# Altium schematic symbol library jlcpcb_2025_04_capacitors_extended_1206.schlib: 2503 symbols (part 11 of 14) (continued)
## GRM31A7U3A330JW31D
designator C?  Capacitance: 33pF  (hidden comment: *)
Capacitor, Ceramic (MLCC), 33pF, ±5%, 1kV, U2J, ±5%, SMD 1206; Manufacturer: Murata Electronics; Manufacturer Part Number: GRM31A7U3A330JW31D; Package Size: 1206; JLCPCB Basic Part: No; JLCPCB Part Number: C162470; Supplier 1: LCSC; Category: Capacitors - MLCC; Supplier Part Number 1: C162470; Tolerance: ±5%; Voltage Rating: 1kV; Temperature Coefficient: U2J; RoHS: Yes; ComponentLink1Description: Datasheet; ComponentLink1URL: https://wmsc.lcsc.com/wmsc/upload/file/pdf/v2/lcsc/1811150411_Murata-Electronics-GRM31A7U3A330JW31D_C162470.pdf; ComponentLink2Description: JLCPCB Part URL; ComponentLink2URL: https://jlcpcb.com/partdetail/C162470; ComponentLink3Description: LCSC Part URL; ComponentLink3URL: https://lcsc.com/product-detail/Multilayer-Ceramic-Capacitors-MLCC---SMD-SMT_Murata-Electronics-Murata-Electronics-GRM31A7U3A330JW31D_C162470.html
footprint CAP-1206 (1206 (3216M) Capacitor)
pins: 1, 2

## GRM31A7U3A331JW31D
designator C?  Capacitance: 330pF  (hidden comment: *)
Capacitor, Ceramic (MLCC), 330pF, ±5%, 1kV, U2J, ±5%, SMD 1206; Manufacturer: Murata Electronics; Manufacturer Part Number: GRM31A7U3A331JW31D; Package Size: 1206; JLCPCB Basic Part: No; JLCPCB Part Number: C162471; Supplier 1: LCSC; Category: Capacitors - MLCC; Supplier Part Number 1: C162471; Tolerance: ±5%; Voltage Rating: 1kV; Temperature Coefficient: U2J; RoHS: Yes; ComponentLink1Description: Datasheet; ComponentLink1URL: https://wmsc.lcsc.com/wmsc/upload/file/pdf/v2/lcsc/2304140030_Murata-Electronics-GRM31A7U3A331JW31D_C162471.pdf; ComponentLink2Description: JLCPCB Part URL; ComponentLink2URL: https://jlcpcb.com/partdetail/C162471; ComponentLink3Description: LCSC Part URL; ComponentLink3URL: https://lcsc.com/product-detail/Multilayer-Ceramic-Capacitors-MLCC---SMD-SMT_Murata-Electronics-Murata-Electronics-GRM31A7U3A331JW31D_C162471.html
footprint CAP-1206 (1206 (3216M) Capacitor)
pins: 1, 2

## GRM31A7U3A470JW31D
designator C?  Capacitance: 47pF  (hidden comment: *)
Capacitor, Ceramic (MLCC), 47pF, ±5%, 1kV, U2J, ±5%, SMD 1206; Manufacturer: Murata Electronics; Manufacturer Part Number: GRM31A7U3A470JW31D; Package Size: 1206; JLCPCB Basic Part: No; JLCPCB Part Number: C668365; Supplier 1: LCSC; Category: Capacitors - MLCC; Supplier Part Number 1: C668365; Tolerance: ±5%; Voltage Rating: 1kV; Temperature Coefficient: U2J; RoHS: Yes; ComponentLink1Description: Datasheet; ComponentLink1URL: https://wmsc.lcsc.com/wmsc/upload/file/pdf/v2/lcsc/2202161830_Murata-Electronics-GRM31A7U3A470JW31D_C668365.pdf; ComponentLink2Description: JLCPCB Part URL; ComponentLink2URL: https://jlcpcb.com/partdetail/C668365; ComponentLink3Description: LCSC Part URL; ComponentLink3URL: https://lcsc.com/product-detail/Multilayer-Ceramic-Capacitors-MLCC---SMD-SMT_Murata-Electronics-Murata-Electronics-GRM31A7U3A470JW31D_C668365.html
footprint CAP-1206 (1206 (3216M) Capacitor)
pins: 1, 2

## GRM31A7U3A680JW31D
designator C?  Capacitance: 68pF  (hidden comment: *)
Capacitor, Ceramic (MLCC), 68pF, ±5%, 1kV, U2J, ±5%, SMD 1206; Manufacturer: Murata Electronics; Manufacturer Part Number: GRM31A7U3A680JW31D; Package Size: 1206; JLCPCB Basic Part: No; JLCPCB Part Number: C703096; Supplier 1: LCSC; Category: Capacitors - MLCC; Supplier Part Number 1: C703096; Tolerance: ±5%; Voltage Rating: 1kV; Temperature Coefficient: U2J; RoHS: Yes; ComponentLink1Description: Datasheet; ComponentLink1URL: https://wmsc.lcsc.com/wmsc/upload/file/pdf/v2/lcsc/2304140030_Murata-Electronics-GRM31A7U3A680JW31D_C703096.pdf; ComponentLink2Description: JLCPCB Part URL; ComponentLink2URL: https://jlcpcb.com/partdetail/C703096; ComponentLink3Description: LCSC Part URL; ComponentLink3URL: https://lcsc.com/product-detail/Multilayer-Ceramic-Capacitors-MLCC---SMD-SMT_Murata-Electronics-Murata-Electronics-GRM31A7U3A680JW31D_C703096.html
footprint CAP-1206 (1206 (3216M) Capacitor)
pins: 1, 2

## GRM31A7U3A820JW31D
designator C?  Capacitance: 82pF  (hidden comment: *)
Capacitor, Ceramic (MLCC), 82pF, ±5%, 1kV, U2J, ±5%, SMD 1206; Manufacturer: Murata Electronics; Manufacturer Part Number: GRM31A7U3A820JW31D; Package Size: 1206; JLCPCB Basic Part: No; JLCPCB Part Number: C711031; Supplier 1: LCSC; Category: Capacitors - MLCC; Supplier Part Number 1: C711031; Tolerance: ±5%; Voltage Rating: 1kV; Temperature Coefficient: U2J; RoHS: Yes; ComponentLink1Description: Datasheet; ComponentLink1URL: https://wmsc.lcsc.com/wmsc/upload/file/pdf/v2/lcsc/2104151942_Murata-Electronics-GRM31A7U3A820JW31D_C711031.pdf; ComponentLink2Description: JLCPCB Part URL; ComponentLink2URL: https://jlcpcb.com/partdetail/C711031; ComponentLink3Description: LCSC Part URL; ComponentLink3URL: https://lcsc.com/product-detail/Multilayer-Ceramic-Capacitors-MLCC---SMD-SMT_Murata-Electronics-Murata-Electronics-GRM31A7U3A820JW31D_C711031.html
footprint CAP-1206 (1206 (3216M) Capacitor)
pins: 1, 2

## GRM31AR72H152KW01D
designator C?  Capacitance: 1.5nF  (hidden comment: *)
Capacitor, Ceramic (MLCC), 1.5nF, ±10%, 500V, X7R, ±10%, SMD 1206; Manufacturer: Murata Electronics; Manufacturer Part Number: GRM31AR72H152KW01D; Package Size: 1206; JLCPCB Basic Part: No; JLCPCB Part Number: C469547; Supplier 1: LCSC; Category: Capacitors - MLCC; Supplier Part Number 1: C469547; Tolerance: ±10%; Voltage Rating: 500V; Temperature Coefficient: X7R; RoHS: Yes; ComponentLink1Description: Datasheet; ComponentLink1URL: https://wmsc.lcsc.com/wmsc/upload/file/pdf/v2/lcsc/2304140030_Murata-Electronics-GRM31AR72H152KW01D_C469547.pdf; ComponentLink2Description: JLCPCB Part URL; ComponentLink2URL: https://jlcpcb.com/partdetail/C469547; ComponentLink3Description: LCSC Part URL; ComponentLink3URL: https://lcsc.com/product-detail/Multilayer-Ceramic-Capacitors-MLCC---SMD-SMT_Murata-Electronics-Murata-Electronics-GRM31AR72H152KW01D_C469547.html
footprint CAP-1206 (1206 (3216M) Capacitor)
pins: 1, 2

## GRM31AR72J103KW01D
designator C?  Capacitance: 10nF  (hidden comment: *)
Capacitor, Ceramic (MLCC), 10nF, ±10%, 630V, X7R, ±10%, SMD 1206; Manufacturer: Murata Electronics; Manufacturer Part Number: GRM31AR72J103KW01D; Package Size: 1206; JLCPCB Basic Part: No; JLCPCB Part Number: C437561; Supplier 1: LCSC; Category: Capacitors - MLCC; Supplier Part Number 1: C437561; Tolerance: ±10%; Voltage Rating: 630V; Temperature Coefficient: X7R; RoHS: Yes; ComponentLink1Description: Datasheet; ComponentLink1URL: https://wmsc.lcsc.com/wmsc/upload/file/pdf/v2/lcsc/2304140030_Murata-Electronics-GRM31AR72J103KW01D_C437561.pdf; ComponentLink2Description: JLCPCB Part URL; ComponentLink2URL: https://jlcpcb.com/partdetail/C437561; ComponentLink3Description: LCSC Part URL; ComponentLink3URL: https://lcsc.com/product-detail/Multilayer-Ceramic-Capacitors-MLCC---SMD-SMT_Murata-Electronics-Murata-Electronics-GRM31AR72J103KW01D_C437561.html
footprint CAP-1206 (1206 (3216M) Capacitor)
pins: 1, 2

## GRM31AR72J222KW01D
designator C?  Capacitance: 2.2nF  (hidden comment: *)
Capacitor, Ceramic (MLCC), 2.2nF, ±10%, 630V, X7R, ±10%, SMD 1206; Manufacturer: Murata Electronics; Manufacturer Part Number: GRM31AR72J222KW01D; Package Size: 1206; JLCPCB Basic Part: No; JLCPCB Part Number: C162473; Supplier 1: LCSC; Category: Capacitors - MLCC; Supplier Part Number 1: C162473; Tolerance: ±10%; Voltage Rating: 630V; Temperature Coefficient: X7R; RoHS: Yes; ComponentLink1Description: Datasheet; ComponentLink1URL: https://wmsc.lcsc.com/wmsc/upload/file/pdf/v2/lcsc/2308111643_Murata-Electronics-GRM31AR72J222KW01D_C162473.pdf; ComponentLink2Description: JLCPCB Part URL; ComponentLink2URL: https://jlcpcb.com/partdetail/C162473; ComponentLink3Description: LCSC Part URL; ComponentLink3URL: https://lcsc.com/product-detail/Multilayer-Ceramic-Capacitors-MLCC---SMD-SMT_Murata-Electronics-Murata-Electronics-GRM31AR72J222KW01D_C162473.html
footprint CAP-1206 (1206 (3216M) Capacitor)
pins: 1, 2

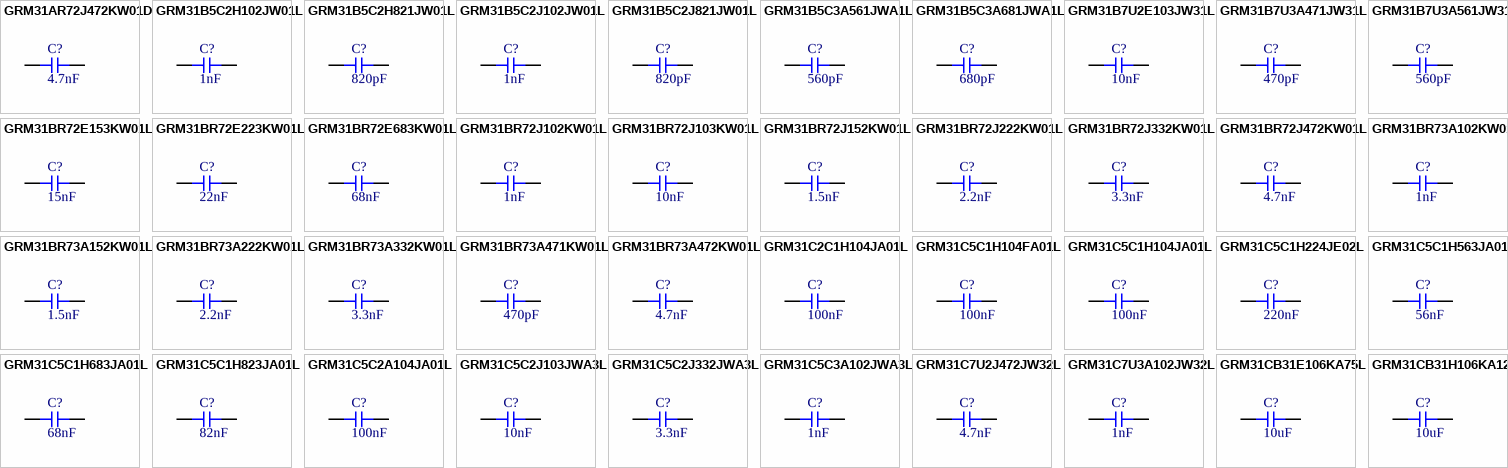
[diagram p47: symbols GRM31AR72J472KW01D to GRM31CB31H106KA12L]

## GRM31AR72J472KW01D
designator C?  Capacitance: 4.7nF  (hidden comment: *)
Capacitor, Ceramic (MLCC), 4.7nF, ±10%, 630V, X7R, ±10%, SMD 1206; Manufacturer: Murata Electronics; Manufacturer Part Number: GRM31AR72J472KW01D; Package Size: 1206; JLCPCB Basic Part: No; JLCPCB Part Number: C162474; Supplier 1: LCSC; Category: Capacitors - MLCC; Supplier Part Number 1: C162474; Tolerance: ±10%; Voltage Rating: 630V; Temperature Coefficient: X7R; RoHS: Yes; ComponentLink1Description: Datasheet; ComponentLink1URL: https://wmsc.lcsc.com/wmsc/upload/file/pdf/v2/lcsc/1912111437_Murata-Electronics-GRM31AR72J472KW01D_C162474.pdf; ComponentLink2Description: JLCPCB Part URL; ComponentLink2URL: https://jlcpcb.com/partdetail/C162474; ComponentLink3Description: LCSC Part URL; ComponentLink3URL: https://lcsc.com/product-detail/Multilayer-Ceramic-Capacitors-MLCC---SMD-SMT_Murata-Electronics-Murata-Electronics-GRM31AR72J472KW01D_C162474.html
footprint CAP-1206 (1206 (3216M) Capacitor)
pins: 1, 2

## GRM31B5C2H102JW01L
designator C?  Capacitance: 1nF  (hidden comment: *)
Capacitor, Ceramic (MLCC), 1nF, ±5%, 500V, C0G, ±5%, SMD 1206; Manufacturer: Murata Electronics; Manufacturer Part Number: GRM31B5C2H102JW01L; Package Size: 1206; JLCPCB Basic Part: No; JLCPCB Part Number: C162475; Supplier 1: LCSC; Category: Capacitors - MLCC; Supplier Part Number 1: C162475; Tolerance: ±5%; Voltage Rating: 500V; Temperature Coefficient: C0G; RoHS: Yes; ComponentLink1Description: Datasheet; ComponentLink1URL: https://wmsc.lcsc.com/wmsc/upload/file/pdf/v2/lcsc/2304140030_Murata-Electronics-GRM31B5C2H102JW01L_C162475.pdf; ComponentLink2Description: JLCPCB Part URL; ComponentLink2URL: https://jlcpcb.com/partdetail/C162475; ComponentLink3Description: LCSC Part URL; ComponentLink3URL: https://lcsc.com/product-detail/Multilayer-Ceramic-Capacitors-MLCC---SMD-SMT_Murata-Electronics-Murata-Electronics-GRM31B5C2H102JW01L_C162475.html
footprint CAP-1206 (1206 (3216M) Capacitor)
pins: 1, 2

## GRM31B5C2H821JW01L
designator C?  Capacitance: 820pF  (hidden comment: *)
Capacitor, Ceramic (MLCC), 820pF, ±5%, 500V, null, ±5%, SMD 1206; Manufacturer: Murata Electronics; Manufacturer Part Number: GRM31B5C2H821JW01L; Package Size: 1206; JLCPCB Basic Part: No; JLCPCB Part Number: C883560; Supplier 1: LCSC; Category: Capacitors - MLCC; Supplier Part Number 1: C883560; Tolerance: ±5%; Voltage Rating: 500V; Temperature Coefficient: null; RoHS: Yes; ComponentLink1Description: Datasheet; ComponentLink1URL: https://wmsc.lcsc.com/wmsc/upload/file/pdf/v2/lcsc/2304140030_Murata-Electronics-GRM31B5C2H821JW01L_C883560.pdf; ComponentLink2Description: JLCPCB Part URL; ComponentLink2URL: https://jlcpcb.com/partdetail/C883560; ComponentLink3Description: LCSC Part URL; ComponentLink3URL: https://lcsc.com/product-detail/Multilayer-Ceramic-Capacitors-MLCC---SMD-SMT_Murata-Electronics-Murata-Electronics-GRM31B5C2H821JW01L_C883560.html
footprint CAP-1206 (1206 (3216M) Capacitor)
pins: 1, 2

## GRM31B5C2J102JW01L
designator C?  Capacitance: 1nF  (hidden comment: *)
Capacitor, Ceramic (MLCC), 1nF, ±5%, 630V, C0G, ±5%, SMD 1206; Manufacturer: Murata Electronics; Manufacturer Part Number: GRM31B5C2J102JW01L; Package Size: 1206; JLCPCB Basic Part: No; JLCPCB Part Number: C162476; Supplier 1: LCSC; Category: Capacitors - MLCC; Supplier Part Number 1: C162476; Tolerance: ±5%; Voltage Rating: 630V; Temperature Coefficient: C0G; RoHS: Yes; ComponentLink1Description: Datasheet; ComponentLink1URL: https://wmsc.lcsc.com/wmsc/upload/file/pdf/v2/lcsc/1810201234_Murata-Electronics-GRM31B5C2J102JW01L_C162476.pdf; ComponentLink2Description: JLCPCB Part URL; ComponentLink2URL: https://jlcpcb.com/partdetail/C162476; ComponentLink3Description: LCSC Part URL; ComponentLink3URL: https://lcsc.com/product-detail/Multilayer-Ceramic-Capacitors-MLCC---SMD-SMT_Murata-Electronics-Murata-Electronics-GRM31B5C2J102JW01L_C162476.html
footprint CAP-1206 (1206 (3216M) Capacitor)
pins: 1, 2

## GRM31B5C2J821JW01L
designator C?  Capacitance: 820pF  (hidden comment: *)
Capacitor, Ceramic (MLCC), 820pF, ±5%, 630V, null, ±5%, SMD 1206; Manufacturer: Murata Electronics; Manufacturer Part Number: GRM31B5C2J821JW01L; Package Size: 1206; JLCPCB Basic Part: No; JLCPCB Part Number: C701157; Supplier 1: LCSC; Category: Capacitors - MLCC; Supplier Part Number 1: C701157; Tolerance: ±5%; Voltage Rating: 630V; Temperature Coefficient: null; RoHS: Yes; ComponentLink1Description: Datasheet; ComponentLink1URL: https://wmsc.lcsc.com/wmsc/upload/file/pdf/v2/lcsc/2011072005_Murata-Electronics-GRM31B5C2J821JW01L_C701157.pdf; ComponentLink2Description: JLCPCB Part URL; ComponentLink2URL: https://jlcpcb.com/partdetail/C701157; ComponentLink3Description: LCSC Part URL; ComponentLink3URL: https://lcsc.com/product-detail/Multilayer-Ceramic-Capacitors-MLCC---SMD-SMT_Murata-Electronics-Murata-Electronics-GRM31B5C2J821JW01L_C701157.html
footprint CAP-1206 (1206 (3216M) Capacitor)
pins: 1, 2

## GRM31B5C3A561JWA1L
designator C?  Capacitance: 560pF  (hidden comment: *)
Capacitor, Ceramic (MLCC), 560pF, ±5%, 1kV, C0G, ±5%, SMD 1206; Manufacturer: Murata Electronics; Manufacturer Part Number: GRM31B5C3A561JWA1L; Package Size: 1206; JLCPCB Basic Part: No; JLCPCB Part Number: C415410; Supplier 1: LCSC; Category: Capacitors - MLCC; Supplier Part Number 1: C415410; Tolerance: ±5%; Voltage Rating: 1kV; Temperature Coefficient: C0G; RoHS: Yes; ComponentLink1Description: Datasheet; ComponentLink1URL: https://wmsc.lcsc.com/wmsc/upload/file/pdf/v2/lcsc/2304140030_Murata-Electronics-GRM31B5C3A561JWA1L_C415410.pdf; ComponentLink2Description: JLCPCB Part URL; ComponentLink2URL: https://jlcpcb.com/partdetail/C415410; ComponentLink3Description: LCSC Part URL; ComponentLink3URL: https://lcsc.com/product-detail/Multilayer-Ceramic-Capacitors-MLCC---SMD-SMT_Murata-Electronics-Murata-Electronics-GRM31B5C3A561JWA1L_C415410.html
footprint CAP-1206 (1206 (3216M) Capacitor)
pins: 1, 2

## GRM31B5C3A681JWA1L
designator C?  Capacitance: 680pF  (hidden comment: *)
Capacitor, Ceramic (MLCC), 680pF, ±5%, ±5%, SMD 1206; Manufacturer: Murata Electronics; Manufacturer Part Number: GRM31B5C3A681JWA1L; Package Size: 1206; JLCPCB Basic Part: No; JLCPCB Part Number: C913483; Supplier 1: LCSC; Category: Capacitors - MLCC; Supplier Part Number 1: C913483; Tolerance: ±5%; RoHS: Yes; ComponentLink1Description: Datasheet; ComponentLink1URL: https://wmsc.lcsc.com/wmsc/upload/file/pdf/v2/lcsc/2201131300_Murata-Electronics-GRM31B5C3A681JWA1L_C913483.pdf; ComponentLink2Description: JLCPCB Part URL; ComponentLink2URL: https://jlcpcb.com/partdetail/C913483; ComponentLink3Description: LCSC Part URL; ComponentLink3URL: https://lcsc.com/product-detail/Multilayer-Ceramic-Capacitors-MLCC---SMD-SMT_Murata-Electronics-Murata-Electronics-GRM31B5C3A681JWA1L_C913483.html
footprint CAP-1206 (1206 (3216M) Capacitor)
pins: 1, 2

## GRM31B7U2E103JW31L
designator C?  Capacitance: 10nF  (hidden comment: *)
Capacitor, Ceramic (MLCC), 10nF, ±5%, 250V, U2J, ±5%, SMD 1206; Manufacturer: Murata Electronics; Manufacturer Part Number: GRM31B7U2E103JW31L; Package Size: 1206; JLCPCB Basic Part: No; JLCPCB Part Number: C426091; Supplier 1: LCSC; Category: Capacitors - MLCC; Supplier Part Number 1: C426091; Tolerance: ±5%; Voltage Rating: 250V; Temperature Coefficient: U2J; RoHS: Yes; ComponentLink1Description: Datasheet; ComponentLink1URL: https://wmsc.lcsc.com/wmsc/upload/file/pdf/v2/lcsc/2304140030_Murata-Electronics-GRM31B7U2E103JW31L_C426091.pdf; ComponentLink2Description: JLCPCB Part URL; ComponentLink2URL: https://jlcpcb.com/partdetail/C426091; ComponentLink3Description: LCSC Part URL; ComponentLink3URL: https://lcsc.com/product-detail/Multilayer-Ceramic-Capacitors-MLCC---SMD-SMT_Murata-Electronics-Murata-Electronics-GRM31B7U2E103JW31L_C426091.html
footprint CAP-1206 (1206 (3216M) Capacitor)
pins: 1, 2

## GRM31B7U3A471JW31L
designator C?  Capacitance: 470pF  (hidden comment: *)
Capacitor, Ceramic (MLCC), 470pF, ±5%, 1kV, U2J, ±5%, SMD 1206; Manufacturer: Murata Electronics; Manufacturer Part Number: GRM31B7U3A471JW31L; Package Size: 1206; JLCPCB Basic Part: No; JLCPCB Part Number: C97936; Supplier 1: LCSC; Category: Capacitors - MLCC; Supplier Part Number 1: C97936; Tolerance: ±5%; Voltage Rating: 1kV; Temperature Coefficient: U2J; RoHS: Yes; ComponentLink1Description: Datasheet; ComponentLink1URL: https://wmsc.lcsc.com/wmsc/upload/file/pdf/v2/lcsc/1810201308_Murata-Electronics-GRM31B7U3A471JW31L_C97936.pdf; ComponentLink2Description: JLCPCB Part URL; ComponentLink2URL: https://jlcpcb.com/partdetail/C97936; ComponentLink3Description: LCSC Part URL; ComponentLink3URL: https://lcsc.com/product-detail/Multilayer-Ceramic-Capacitors-MLCC---SMD-SMT_Murata-Electronics-Murata-Electronics-GRM31B7U3A471JW31L_C97936.html
footprint CAP-1206 (1206 (3216M) Capacitor)
pins: 1, 2

## GRM31B7U3A561JW31L
designator C?  Capacitance: 560pF  (hidden comment: *)
Capacitor, Ceramic (MLCC), 560pF, ±5%, 1kV, U2J, ±5%, SMD 1206; Manufacturer: Murata Electronics; Manufacturer Part Number: GRM31B7U3A561JW31L; Package Size: 1206; JLCPCB Basic Part: No; JLCPCB Part Number: C711035; Supplier 1: LCSC; Category: Capacitors - MLCC; Supplier Part Number 1: C711035; Tolerance: ±5%; Voltage Rating: 1kV; Temperature Coefficient: U2J; RoHS: Yes; ComponentLink1Description: Datasheet; ComponentLink1URL: https://wmsc.lcsc.com/wmsc/upload/file/pdf/v2/lcsc/2012231244_Murata-Electronics-GRM31B7U3A561JW31L_C711035.pdf; ComponentLink2Description: JLCPCB Part URL; ComponentLink2URL: https://jlcpcb.com/partdetail/C711035; ComponentLink3Description: LCSC Part URL; ComponentLink3URL: https://lcsc.com/product-detail/Multilayer-Ceramic-Capacitors-MLCC---SMD-SMT_Murata-Electronics-Murata-Electronics-GRM31B7U3A561JW31L_C711035.html
footprint CAP-1206 (1206 (3216M) Capacitor)
pins: 1, 2

## GRM31BR72E153KW01L
designator C?  Capacitance: 15nF  (hidden comment: *)
Capacitor, Ceramic (MLCC), 15nF, ±10%, 250V, X7R, ±10%, SMD 1206; Manufacturer: Murata Electronics; Manufacturer Part Number: GRM31BR72E153KW01L; Package Size: 1206; JLCPCB Basic Part: No; JLCPCB Part Number: C162477; Supplier 1: LCSC; Category: Capacitors - MLCC; Supplier Part Number 1: C162477; Tolerance: ±10%; Voltage Rating: 250V; Temperature Coefficient: X7R; RoHS: Yes; ComponentLink1Description: Datasheet; ComponentLink1URL: https://wmsc.lcsc.com/wmsc/upload/file/pdf/v2/lcsc/1810201234_Murata-Electronics-GRM31BR72E153KW01L_C162477.pdf; ComponentLink2Description: JLCPCB Part URL; ComponentLink2URL: https://jlcpcb.com/partdetail/C162477; ComponentLink3Description: LCSC Part URL; ComponentLink3URL: https://lcsc.com/product-detail/Multilayer-Ceramic-Capacitors-MLCC---SMD-SMT_Murata-Electronics-Murata-Electronics-GRM31BR72E153KW01L_C162477.html
footprint CAP-1206 (1206 (3216M) Capacitor)
pins: 1, 2

## GRM31BR72E223KW01L
designator C?  Capacitance: 22nF  (hidden comment: *)
Capacitor, Ceramic (MLCC), 22nF, ±10%, 250V, X7R, ±10%, SMD 1206; Manufacturer: Murata Electronics; Manufacturer Part Number: GRM31BR72E223KW01L; Package Size: 1206; JLCPCB Basic Part: No; JLCPCB Part Number: C86048; Supplier 1: LCSC; Category: Capacitors - MLCC; Supplier Part Number 1: C86048; Tolerance: ±10%; Voltage Rating: 250V; Temperature Coefficient: X7R; RoHS: Yes; ComponentLink1Description: Datasheet; ComponentLink1URL: https://wmsc.lcsc.com/wmsc/upload/file/pdf/v2/lcsc/2304140030_Murata-Electronics-GRM31BR72E223KW01L_C86048.pdf; ComponentLink2Description: JLCPCB Part URL; ComponentLink2URL: https://jlcpcb.com/partdetail/C86048; ComponentLink3Description: LCSC Part URL; ComponentLink3URL: https://lcsc.com/product-detail/Multilayer-Ceramic-Capacitors-MLCC---SMD-SMT_Murata-Electronics-Murata-Electronics-GRM31BR72E223KW01L_C86048.html
footprint CAP-1206 (1206 (3216M) Capacitor)
pins: 1, 2

## GRM31BR72E683KW01L
designator C?  Capacitance: 68nF  (hidden comment: *)
Capacitor, Ceramic (MLCC), 68nF, ±10%, 250V, X7R, ±10%, SMD 1206; Manufacturer: Murata Electronics; Manufacturer Part Number: GRM31BR72E683KW01L; Package Size: 1206; JLCPCB Basic Part: No; JLCPCB Part Number: C162478; Supplier 1: LCSC; Category: Capacitors - MLCC; Supplier Part Number 1: C162478; Tolerance: ±10%; Voltage Rating: 250V; Temperature Coefficient: X7R; RoHS: Yes; ComponentLink1Description: Datasheet; ComponentLink1URL: https://wmsc.lcsc.com/wmsc/upload/file/pdf/v2/lcsc/1810201241_Murata-Electronics-GRM31BR72E683KW01L_C162478.pdf; ComponentLink2Description: JLCPCB Part URL; ComponentLink2URL: https://jlcpcb.com/partdetail/C162478; ComponentLink3Description: LCSC Part URL; ComponentLink3URL: https://lcsc.com/product-detail/Multilayer-Ceramic-Capacitors-MLCC---SMD-SMT_Murata-Electronics-Murata-Electronics-GRM31BR72E683KW01L_C162478.html
footprint CAP-1206 (1206 (3216M) Capacitor)
pins: 1, 2

## GRM31BR72J102KW01L
designator C?  Capacitance: 1nF  (hidden comment: *)
Capacitor, Ceramic (MLCC), 1nF, ±10%, 630V, X7R, ±10%, SMD 1206; Manufacturer: Murata Electronics; Manufacturer Part Number: GRM31BR72J102KW01L; Package Size: 1206; JLCPCB Basic Part: No; JLCPCB Part Number: C97937; Supplier 1: LCSC; Category: Capacitors - MLCC; Supplier Part Number 1: C97937; Tolerance: ±10%; Voltage Rating: 630V; Temperature Coefficient: X7R; RoHS: Yes; ComponentLink1Description: Datasheet; ComponentLink1URL: https://wmsc.lcsc.com/wmsc/upload/file/pdf/v2/lcsc/1811122014_Murata-Electronics-GRM31BR72J102KW01L_C97937.pdf; ComponentLink2Description: JLCPCB Part URL; ComponentLink2URL: https://jlcpcb.com/partdetail/C97937; ComponentLink3Description: LCSC Part URL; ComponentLink3URL: https://lcsc.com/product-detail/Multilayer-Ceramic-Capacitors-MLCC---SMD-SMT_Murata-Electronics-Murata-Electronics-GRM31BR72J102KW01L_C97937.html
footprint CAP-1206 (1206 (3216M) Capacitor)
pins: 1, 2

## GRM31BR72J103KW01L
designator C?  Capacitance: 10nF  (hidden comment: *)
Capacitor, Ceramic (MLCC), 10nF, ±10%, 630V, X7R, ±10%, SMD 1206; Manufacturer: Murata Electronics; Manufacturer Part Number: GRM31BR72J103KW01L; Package Size: 1206; JLCPCB Basic Part: No; JLCPCB Part Number: C76989; Supplier 1: LCSC; Category: Capacitors - MLCC; Supplier Part Number 1: C76989; Tolerance: ±10%; Voltage Rating: 630V; Temperature Coefficient: X7R; RoHS: Yes; ComponentLink1Description: Datasheet; ComponentLink1URL: https://wmsc.lcsc.com/wmsc/upload/file/pdf/v2/lcsc/1810201310_Murata-Electronics-GRM31BR72J103KW01L_C76989.pdf; ComponentLink2Description: JLCPCB Part URL; ComponentLink2URL: https://jlcpcb.com/partdetail/C76989; ComponentLink3Description: LCSC Part URL; ComponentLink3URL: https://lcsc.com/product-detail/Multilayer-Ceramic-Capacitors-MLCC---SMD-SMT_Murata-Electronics-Murata-Electronics-GRM31BR72J103KW01L_C76989.html
footprint CAP-1206 (1206 (3216M) Capacitor)
pins: 1, 2

## GRM31BR72J152KW01L
designator C?  Capacitance: 1.5nF  (hidden comment: *)
Capacitor, Ceramic (MLCC), 1.5nF, ±10%, 630V, X7R, ±10%, SMD 1206; Manufacturer: Murata Electronics; Manufacturer Part Number: GRM31BR72J152KW01L; Package Size: 1206; JLCPCB Basic Part: No; JLCPCB Part Number: C162479; Supplier 1: LCSC; Category: Capacitors - MLCC; Supplier Part Number 1: C162479; Tolerance: ±10%; Voltage Rating: 630V; Temperature Coefficient: X7R; RoHS: Yes; ComponentLink1Description: Datasheet; ComponentLink1URL: https://wmsc.lcsc.com/wmsc/upload/file/pdf/v2/lcsc/1810201241_Murata-Electronics-GRM31BR72J152KW01L_C162479.pdf; ComponentLink2Description: JLCPCB Part URL; ComponentLink2URL: https://jlcpcb.com/partdetail/C162479; ComponentLink3Description: LCSC Part URL; ComponentLink3URL: https://lcsc.com/product-detail/Multilayer-Ceramic-Capacitors-MLCC---SMD-SMT_Murata-Electronics-Murata-Electronics-GRM31BR72J152KW01L_C162479.html
footprint CAP-1206 (1206 (3216M) Capacitor)
pins: 1, 2

## GRM31BR72J222KW01L
designator C?  Capacitance: 2.2nF  (hidden comment: *)
Capacitor, Ceramic (MLCC), 2.2nF, ±10%, 630V, X7R, ±10%, SMD 1206; Manufacturer: Murata Electronics; Manufacturer Part Number: GRM31BR72J222KW01L; Package Size: 1206; JLCPCB Basic Part: No; JLCPCB Part Number: C97938; Supplier 1: LCSC; Category: Capacitors - MLCC; Supplier Part Number 1: C97938; Tolerance: ±10%; Voltage Rating: 630V; Temperature Coefficient: X7R; RoHS: Yes; ComponentLink1Description: Datasheet; ComponentLink1URL: https://wmsc.lcsc.com/wmsc/upload/file/pdf/v2/lcsc/1810201314_Murata-Electronics-GRM31BR72J222KW01L_C97938.pdf; ComponentLink2Description: JLCPCB Part URL; ComponentLink2URL: https://jlcpcb.com/partdetail/C97938; ComponentLink3Description: LCSC Part URL; ComponentLink3URL: https://lcsc.com/product-detail/Multilayer-Ceramic-Capacitors-MLCC---SMD-SMT_Murata-Electronics-Murata-Electronics-GRM31BR72J222KW01L_C97938.html
footprint CAP-1206 (1206 (3216M) Capacitor)
pins: 1, 2

## GRM31BR72J332KW01L
designator C?  Capacitance: 3.3nF  (hidden comment: *)
Capacitor, Ceramic (MLCC), 3.3nF, ±10%, 630V, X7R, ±10%, SMD 1206; Manufacturer: Murata Electronics; Manufacturer Part Number: GRM31BR72J332KW01L; Package Size: 1206; JLCPCB Basic Part: No; JLCPCB Part Number: C97939; Supplier 1: LCSC; Category: Capacitors - MLCC; Supplier Part Number 1: C97939; Tolerance: ±10%; Voltage Rating: 630V; Temperature Coefficient: X7R; RoHS: Yes; ComponentLink1Description: Datasheet; ComponentLink1URL: https://wmsc.lcsc.com/wmsc/upload/file/pdf/v2/lcsc/1810201314_Murata-Electronics-GRM31BR72J332KW01L_C97939.pdf; ComponentLink2Description: JLCPCB Part URL; ComponentLink2URL: https://jlcpcb.com/partdetail/C97939; ComponentLink3Description: LCSC Part URL; ComponentLink3URL: https://lcsc.com/product-detail/Multilayer-Ceramic-Capacitors-MLCC---SMD-SMT_Murata-Electronics-Murata-Electronics-GRM31BR72J332KW01L_C97939.html
footprint CAP-1206 (1206 (3216M) Capacitor)
pins: 1, 2

## GRM31BR72J472KW01L
designator C?  Capacitance: 4.7nF  (hidden comment: *)
Capacitor, Ceramic (MLCC), 4.7nF, ±10%, 630V, X7R, ±10%, SMD 1206; Manufacturer: Murata Electronics; Manufacturer Part Number: GRM31BR72J472KW01L; Package Size: 1206; JLCPCB Basic Part: No; JLCPCB Part Number: C97940; Supplier 1: LCSC; Category: Capacitors - MLCC; Supplier Part Number 1: C97940; Tolerance: ±10%; Voltage Rating: 630V; Temperature Coefficient: X7R; RoHS: Yes; ComponentLink1Description: Datasheet; ComponentLink1URL: https://wmsc.lcsc.com/wmsc/upload/file/pdf/v2/lcsc/1811142010_Murata-Electronics-GRM31BR72J472KW01L_C97940.pdf; ComponentLink2Description: JLCPCB Part URL; ComponentLink2URL: https://jlcpcb.com/partdetail/C97940; ComponentLink3Description: LCSC Part URL; ComponentLink3URL: https://lcsc.com/product-detail/Multilayer-Ceramic-Capacitors-MLCC---SMD-SMT_Murata-Electronics-Murata-Electronics-GRM31BR72J472KW01L_C97940.html
footprint CAP-1206 (1206 (3216M) Capacitor)
pins: 1, 2

## GRM31BR73A102KW01L
designator C?  Capacitance: 1nF  (hidden comment: *)
Capacitor, Ceramic (MLCC), 1nF, ±10%, 1kV, X7R, ±10%, SMD 1206; Manufacturer: Murata Electronics; Manufacturer Part Number: GRM31BR73A102KW01L; Package Size: 1206; JLCPCB Basic Part: No; JLCPCB Part Number: C97941; Supplier 1: LCSC; Category: Capacitors - MLCC; Supplier Part Number 1: C97941; Tolerance: ±10%; Voltage Rating: 1kV; Temperature Coefficient: X7R; RoHS: Yes; ComponentLink1Description: Datasheet; ComponentLink1URL: https://wmsc.lcsc.com/wmsc/upload/file/pdf/v2/lcsc/1810201308_Murata-Electronics-GRM31BR73A102KW01L_C97941.pdf; ComponentLink2Description: JLCPCB Part URL; ComponentLink2URL: https://jlcpcb.com/partdetail/C97941; ComponentLink3Description: LCSC Part URL; ComponentLink3URL: https://lcsc.com/product-detail/Multilayer-Ceramic-Capacitors-MLCC---SMD-SMT_Murata-Electronics-Murata-Electronics-GRM31BR73A102KW01L_C97941.html
footprint CAP-1206 (1206 (3216M) Capacitor)
pins: 1, 2

## GRM31BR73A152KW01L
designator C?  Capacitance: 1.5nF  (hidden comment: *)
Capacitor, Ceramic (MLCC), 1.5nF, ±10%, 1kV, X7R, ±10%, SMD 1206; Manufacturer: Murata Electronics; Manufacturer Part Number: GRM31BR73A152KW01L; Package Size: 1206; JLCPCB Basic Part: No; JLCPCB Part Number: C237590; Supplier 1: LCSC; Category: Capacitors - MLCC; Supplier Part Number 1: C237590; Tolerance: ±10%; Voltage Rating: 1kV; Temperature Coefficient: X7R; RoHS: Yes; ComponentLink1Description: Datasheet; ComponentLink1URL: https://wmsc.lcsc.com/wmsc/upload/file/pdf/v2/lcsc/1912111437_Murata-Electronics-GRM31BR73A152KW01L_C237590.pdf; ComponentLink2Description: JLCPCB Part URL; ComponentLink2URL: https://jlcpcb.com/partdetail/C237590; ComponentLink3Description: LCSC Part URL; ComponentLink3URL: https://lcsc.com/product-detail/Multilayer-Ceramic-Capacitors-MLCC---SMD-SMT_Murata-Electronics-Murata-Electronics-GRM31BR73A152KW01L_C237590.html
footprint CAP-1206 (1206 (3216M) Capacitor)
pins: 1, 2

## GRM31BR73A222KW01L
designator C?  Capacitance: 2.2nF  (hidden comment: *)
Capacitor, Ceramic (MLCC), 2.2nF, ±10%, 1kV, X7R, ±10%, SMD 1206; Manufacturer: Murata Electronics; Manufacturer Part Number: GRM31BR73A222KW01L; Package Size: 1206; JLCPCB Basic Part: No; JLCPCB Part Number: C97942; Supplier 1: LCSC; Category: Capacitors - MLCC; Supplier Part Number 1: C97942; Tolerance: ±10%; Voltage Rating: 1kV; Temperature Coefficient: X7R; RoHS: Yes; ComponentLink1Description: Datasheet; ComponentLink1URL: https://wmsc.lcsc.com/wmsc/upload/file/pdf/v2/lcsc/1810201308_Murata-Electronics-GRM31BR73A222KW01L_C97942.pdf; ComponentLink2Description: JLCPCB Part URL; ComponentLink2URL: https://jlcpcb.com/partdetail/C97942; ComponentLink3Description: LCSC Part URL; ComponentLink3URL: https://lcsc.com/product-detail/Multilayer-Ceramic-Capacitors-MLCC---SMD-SMT_Murata-Electronics-Murata-Electronics-GRM31BR73A222KW01L_C97942.html
footprint CAP-1206 (1206 (3216M) Capacitor)
pins: 1, 2

## GRM31BR73A332KW01L
designator C?  Capacitance: 3.3nF  (hidden comment: *)
Capacitor, Ceramic (MLCC), 3.3nF, ±10%, 1kV, X7R, ±10%, SMD 1206; Manufacturer: Murata Electronics; Manufacturer Part Number: GRM31BR73A332KW01L; Package Size: 1206; JLCPCB Basic Part: No; JLCPCB Part Number: C162481; Supplier 1: LCSC; Category: Capacitors - MLCC; Supplier Part Number 1: C162481; Tolerance: ±10%; Voltage Rating: 1kV; Temperature Coefficient: X7R; RoHS: Yes; ComponentLink1Description: Datasheet; ComponentLink1URL: https://wmsc.lcsc.com/wmsc/upload/file/pdf/v2/lcsc/1810201249_Murata-Electronics-GRM31BR73A332KW01L_C162481.pdf; ComponentLink2Description: JLCPCB Part URL; ComponentLink2URL: https://jlcpcb.com/partdetail/C162481; ComponentLink3Description: LCSC Part URL; ComponentLink3URL: https://lcsc.com/product-detail/Multilayer-Ceramic-Capacitors-MLCC---SMD-SMT_Murata-Electronics-Murata-Electronics-GRM31BR73A332KW01L_C162481.html
footprint CAP-1206 (1206 (3216M) Capacitor)
pins: 1, 2

## GRM31BR73A471KW01L
designator C?  Capacitance: 470pF  (hidden comment: *)
Capacitor, Ceramic (MLCC), 470pF, ±10%, 1kV, X7R, ±10%, SMD 1206; Manufacturer: Murata Electronics; Manufacturer Part Number: GRM31BR73A471KW01L; Package Size: 1206; JLCPCB Basic Part: No; JLCPCB Part Number: C97943; Supplier 1: LCSC; Category: Capacitors - MLCC; Supplier Part Number 1: C97943; Tolerance: ±10%; Voltage Rating: 1kV; Temperature Coefficient: X7R; RoHS: Yes; ComponentLink1Description: Datasheet; ComponentLink1URL: https://wmsc.lcsc.com/wmsc/upload/file/pdf/v2/lcsc/1810201314_Murata-Electronics-GRM31BR73A471KW01L_C97943.pdf; ComponentLink2Description: JLCPCB Part URL; ComponentLink2URL: https://jlcpcb.com/partdetail/C97943; ComponentLink3Description: LCSC Part URL; ComponentLink3URL: https://lcsc.com/product-detail/Multilayer-Ceramic-Capacitors-MLCC---SMD-SMT_Murata-Electronics-Murata-Electronics-GRM31BR73A471KW01L_C97943.html
footprint CAP-1206 (1206 (3216M) Capacitor)
pins: 1, 2

## GRM31BR73A472KW01L
designator C?  Capacitance: 4.7nF  (hidden comment: *)
Capacitor, Ceramic (MLCC), 4.7nF, ±10%, 1kV, X7R, ±10%, SMD 1206; Manufacturer: Murata Electronics; Manufacturer Part Number: GRM31BR73A472KW01L; Package Size: 1206; JLCPCB Basic Part: No; JLCPCB Part Number: C97944; Supplier 1: LCSC; Category: Capacitors - MLCC; Supplier Part Number 1: C97944; Tolerance: ±10%; Voltage Rating: 1kV; Temperature Coefficient: X7R; RoHS: Yes; ComponentLink1Description: Datasheet; ComponentLink1URL: https://wmsc.lcsc.com/wmsc/upload/file/pdf/v2/lcsc/1810201308_Murata-Electronics-GRM31BR73A472KW01L_C97944.pdf; ComponentLink2Description: JLCPCB Part URL; ComponentLink2URL: https://jlcpcb.com/partdetail/C97944; ComponentLink3Description: LCSC Part URL; ComponentLink3URL: https://lcsc.com/product-detail/Multilayer-Ceramic-Capacitors-MLCC---SMD-SMT_Murata-Electronics-Murata-Electronics-GRM31BR73A472KW01L_C97944.html
footprint CAP-1206 (1206 (3216M) Capacitor)
pins: 1, 2

## GRM31C2C1H104JA01L
designator C?  Capacitance: 100nF  (hidden comment: *)
Capacitor, Ceramic (MLCC), 100nF, ±5%, 50V, CH, ±5%, SMD 1206; Manufacturer: Murata Electronics; Manufacturer Part Number: GRM31C2C1H104JA01L; Package Size: 1206; JLCPCB Basic Part: No; JLCPCB Part Number: C397309; Supplier 1: LCSC; Category: Capacitors - MLCC; Supplier Part Number 1: C397309; Tolerance: ±5%; Voltage Rating: 50V; Temperature Coefficient: CH; RoHS: Yes; ComponentLink1Description: Datasheet; ComponentLink1URL: https://wmsc.lcsc.com/wmsc/upload/file/pdf/v2/lcsc/1912111437_Murata-Electronics-GRM31C2C1H104JA01L_C397309.pdf; ComponentLink2Description: JLCPCB Part URL; ComponentLink2URL: https://jlcpcb.com/partdetail/C397309; ComponentLink3Description: LCSC Part URL; ComponentLink3URL: https://lcsc.com/product-detail/Multilayer-Ceramic-Capacitors-MLCC---SMD-SMT_Murata-Electronics-Murata-Electronics-GRM31C2C1H104JA01L_C397309.html
footprint CAP-1206 (1206 (3216M) Capacitor)
pins: 1, 2

## GRM31C5C1H104FA01L
designator C?  Capacitance: 100nF  (hidden comment: *)
Capacitor, Ceramic (MLCC), 100nF, ±1%, 50V, C0G, ±1%, SMD 1206; Manufacturer: Murata Electronics; Manufacturer Part Number: GRM31C5C1H104FA01L; Package Size: 1206; JLCPCB Basic Part: No; JLCPCB Part Number: C2981728; Supplier 1: LCSC; Category: Capacitors - MLCC; Supplier Part Number 1: C2981728; Tolerance: ±1%; Voltage Rating: 50V; Temperature Coefficient: C0G; RoHS: Yes; ComponentLink1Description: Datasheet; ComponentLink1URL: https://wmsc.lcsc.com/wmsc/upload/file/pdf/v2/lcsc/2203241030_Murata-Electronics-GRM31C5C1H104FA01L_C2981728.pdf; ComponentLink2Description: JLCPCB Part URL; ComponentLink2URL: https://jlcpcb.com/partdetail/C2981728; ComponentLink3Description: LCSC Part URL; ComponentLink3URL: https://lcsc.com/product-detail/Multilayer-Ceramic-Capacitors-MLCC---SMD-SMT_Murata-Electronics-Murata-Electronics-GRM31C5C1H104FA01L_C2981728.html
footprint CAP-1206 (1206 (3216M) Capacitor)
pins: 1, 2

## GRM31C5C1H104JA01L
designator C?  Capacitance: 100nF  (hidden comment: *)
Capacitor, Ceramic (MLCC), 100nF, ±5%, 50V, C0G, ±5%, SMD 1206; Manufacturer: Murata Electronics; Manufacturer Part Number: GRM31C5C1H104JA01L; Package Size: 1206; JLCPCB Basic Part: No; JLCPCB Part Number: C97946; Supplier 1: LCSC; Category: Capacitors - MLCC; Supplier Part Number 1: C97946; Tolerance: ±5%; Voltage Rating: 50V; Temperature Coefficient: C0G; RoHS: Yes; ComponentLink1Description: Datasheet; ComponentLink1URL: https://wmsc.lcsc.com/wmsc/upload/file/pdf/v2/lcsc/1810201313_Murata-Electronics-GRM31C5C1H104JA01L_C97946.pdf; ComponentLink2Description: JLCPCB Part URL; ComponentLink2URL: https://jlcpcb.com/partdetail/C97946; ComponentLink3Description: LCSC Part URL; ComponentLink3URL: https://lcsc.com/product-detail/Multilayer-Ceramic-Capacitors-MLCC---SMD-SMT_Murata-Electronics-Murata-Electronics-GRM31C5C1H104JA01L_C97946.html
footprint CAP-1206 (1206 (3216M) Capacitor)
pins: 1, 2

## GRM31C5C1H224JE02L
designator C?  Capacitance: 220nF  (hidden comment: *)
Capacitor, Ceramic (MLCC), 220nF, ±5%, 50V, C0G, ±5%, SMD 1206; Manufacturer: Murata Electronics; Manufacturer Part Number: GRM31C5C1H224JE02L; Package Size: 1206; JLCPCB Basic Part: No; JLCPCB Part Number: C464977; Supplier 1: LCSC; Category: Capacitors - MLCC; Supplier Part Number 1: C464977; Tolerance: ±5%; Voltage Rating: 50V; Temperature Coefficient: C0G; RoHS: Yes; ComponentLink1Description: Datasheet; ComponentLink1URL: https://wmsc.lcsc.com/wmsc/upload/file/pdf/v2/lcsc/2001141507_Murata-Electronics-GRM31C5C1H224JE02L_C464977.pdf; ComponentLink2Description: JLCPCB Part URL; ComponentLink2URL: https://jlcpcb.com/partdetail/C464977; ComponentLink3Description: LCSC Part URL; ComponentLink3URL: https://lcsc.com/product-detail/Multilayer-Ceramic-Capacitors-MLCC---SMD-SMT_Murata-Electronics-Murata-Electronics-GRM31C5C1H224JE02L_C464977.html
footprint CAP-1206 (1206 (3216M) Capacitor)
pins: 1, 2

## GRM31C5C1H563JA01L
designator C?  Capacitance: 56nF  (hidden comment: *)
Capacitor, Ceramic (MLCC), 56nF, ±5%, 50V, C0G, ±5%, SMD 1206; Manufacturer: Murata Electronics; Manufacturer Part Number: GRM31C5C1H563JA01L; Package Size: 1206; JLCPCB Basic Part: No; JLCPCB Part Number: C441752; Supplier 1: LCSC; Category: Capacitors - MLCC; Supplier Part Number 1: C441752; Tolerance: ±5%; Voltage Rating: 50V; Temperature Coefficient: C0G; RoHS: Yes; ComponentLink1Description: Datasheet; ComponentLink1URL: https://wmsc.lcsc.com/wmsc/upload/file/pdf/v2/lcsc/2304140030_Murata-Electronics-GRM31C5C1H563JA01L_C441752.pdf; ComponentLink2Description: JLCPCB Part URL; ComponentLink2URL: https://jlcpcb.com/partdetail/C441752; ComponentLink3Description: LCSC Part URL; ComponentLink3URL: https://lcsc.com/product-detail/Multilayer-Ceramic-Capacitors-MLCC---SMD-SMT_Murata-Electronics-Murata-Electronics-GRM31C5C1H563JA01L_C441752.html
footprint CAP-1206 (1206 (3216M) Capacitor)
pins: 1, 2

## GRM31C5C1H683JA01L
designator C?  Capacitance: 68nF  (hidden comment: *)
Capacitor, Ceramic (MLCC), 68nF, ±5%, 50V, C0G, ±5%, SMD 1206; Manufacturer: Murata Electronics; Manufacturer Part Number: GRM31C5C1H683JA01L; Package Size: 1206; JLCPCB Basic Part: No; JLCPCB Part Number: C77084; Supplier 1: LCSC; Category: Capacitors - MLCC; Supplier Part Number 1: C77084; Tolerance: ±5%; Voltage Rating: 50V; Temperature Coefficient: C0G; RoHS: Yes; ComponentLink1Description: Datasheet; ComponentLink1URL: https://wmsc.lcsc.com/wmsc/upload/file/pdf/v2/lcsc/2304140030_Murata-Electronics-GRM31C5C1H683JA01L_C77084.pdf; ComponentLink2Description: JLCPCB Part URL; ComponentLink2URL: https://jlcpcb.com/partdetail/C77084; ComponentLink3Description: LCSC Part URL; ComponentLink3URL: https://lcsc.com/product-detail/Multilayer-Ceramic-Capacitors-MLCC---SMD-SMT_Murata-Electronics-Murata-Electronics-GRM31C5C1H683JA01L_C77084.html
footprint CAP-1206 (1206 (3216M) Capacitor)
pins: 1, 2

## GRM31C5C1H823JA01L
designator C?  Capacitance: 82nF  (hidden comment: *)
Capacitor, Ceramic (MLCC), 82nF, ±5%, 50V, C0G, ±5%, SMD 1206; Manufacturer: Murata Electronics; Manufacturer Part Number: GRM31C5C1H823JA01L; Package Size: 1206; JLCPCB Basic Part: No; JLCPCB Part Number: C97947; Supplier 1: LCSC; Category: Capacitors - MLCC; Supplier Part Number 1: C97947; Tolerance: ±5%; Voltage Rating: 50V; Temperature Coefficient: C0G; RoHS: Yes; ComponentLink1Description: Datasheet; ComponentLink1URL: https://wmsc.lcsc.com/wmsc/upload/file/pdf/v2/lcsc/1810201308_Murata-Electronics-GRM31C5C1H823JA01L_C97947.pdf; ComponentLink2Description: JLCPCB Part URL; ComponentLink2URL: https://jlcpcb.com/partdetail/C97947; ComponentLink3Description: LCSC Part URL; ComponentLink3URL: https://lcsc.com/product-detail/Multilayer-Ceramic-Capacitors-MLCC---SMD-SMT_Murata-Electronics-Murata-Electronics-GRM31C5C1H823JA01L_C97947.html
footprint CAP-1206 (1206 (3216M) Capacitor)
pins: 1, 2

## GRM31C5C2A104JA01L
designator C?  Capacitance: 100nF  (hidden comment: *)
Capacitor, Ceramic (MLCC), 100nF, ±5%, 100V, C0G, ±5%, SMD 1206; Manufacturer: Murata Electronics; Manufacturer Part Number: GRM31C5C2A104JA01L; Package Size: 1206; JLCPCB Basic Part: No; JLCPCB Part Number: C405303; Supplier 1: LCSC; Category: Capacitors - MLCC; Supplier Part Number 1: C405303; Tolerance: ±5%; Voltage Rating: 100V; Temperature Coefficient: C0G; RoHS: Yes; ComponentLink1Description: Datasheet; ComponentLink1URL: https://wmsc.lcsc.com/wmsc/upload/file/pdf/v2/lcsc/1912111437_Murata-Electronics-GRM31C5C2A104JA01L_C405303.pdf; ComponentLink2Description: JLCPCB Part URL; ComponentLink2URL: https://jlcpcb.com/partdetail/C405303; ComponentLink3Description: LCSC Part URL; ComponentLink3URL: https://lcsc.com/product-detail/Multilayer-Ceramic-Capacitors-MLCC---SMD-SMT_Murata-Electronics-Murata-Electronics-GRM31C5C2A104JA01L_C405303.html
footprint CAP-1206 (1206 (3216M) Capacitor)
pins: 1, 2

## GRM31C5C2J103JWA3L
designator C?  Capacitance: 10nF  (hidden comment: *)
Capacitor, Ceramic (MLCC), 10nF, ±5%, ±5%, SMD 1206; Manufacturer: Murata Electronics; Manufacturer Part Number: GRM31C5C2J103JWA3L; Package Size: 1206; JLCPCB Basic Part: No; JLCPCB Part Number: C883613; Supplier 1: LCSC; Category: Capacitors - MLCC; Supplier Part Number 1: C883613; Tolerance: ±5%; RoHS: Yes; ComponentLink1Description: Datasheet; ComponentLink1URL: https://wmsc.lcsc.com/wmsc/upload/file/pdf/v2/lcsc/2201131200_Murata-Electronics-GRM31C5C2J103JWA3L_C883613.pdf; ComponentLink2Description: JLCPCB Part URL; ComponentLink2URL: https://jlcpcb.com/partdetail/C883613; ComponentLink3Description: LCSC Part URL; ComponentLink3URL: https://lcsc.com/product-detail/Multilayer-Ceramic-Capacitors-MLCC---SMD-SMT_Murata-Electronics-Murata-Electronics-GRM31C5C2J103JWA3L_C883613.html
footprint CAP-1206 (1206 (3216M) Capacitor)
pins: 1, 2

## GRM31C5C2J332JWA3L
designator C?  Capacitance: 3.3nF  (hidden comment: *)
Capacitor, Ceramic (MLCC), 3.3nF, ±5%, ±5%, SMD 1206; Manufacturer: Murata Electronics; Manufacturer Part Number: GRM31C5C2J332JWA3L; Package Size: 1206; JLCPCB Basic Part: No; JLCPCB Part Number: C909832; Supplier 1: LCSC; Category: Capacitors - MLCC; Supplier Part Number 1: C909832; Tolerance: ±5%; RoHS: Yes; ComponentLink1Description: Datasheet; ComponentLink1URL: https://wmsc.lcsc.com/wmsc/upload/file/pdf/v2/lcsc/2304140030_Murata-Electronics-GRM31C5C2J332JWA3L_C909832.pdf; ComponentLink2Description: JLCPCB Part URL; ComponentLink2URL: https://jlcpcb.com/partdetail/C909832; ComponentLink3Description: LCSC Part URL; ComponentLink3URL: https://lcsc.com/product-detail/Multilayer-Ceramic-Capacitors-MLCC---SMD-SMT_Murata-Electronics-Murata-Electronics-GRM31C5C2J332JWA3L_C909832.html
footprint CAP-1206 (1206 (3216M) Capacitor)
pins: 1, 2

## GRM31C5C3A102JWA3L
designator C?  Capacitance: 1nF  (hidden comment: *)
Capacitor, Ceramic (MLCC), 1nF, ±5%, 1kV, C0G, ±5%, SMD 1206; Manufacturer: Murata Electronics; Manufacturer Part Number: GRM31C5C3A102JWA3L; Package Size: 1206; JLCPCB Basic Part: No; JLCPCB Part Number: C521240; Supplier 1: LCSC; Category: Capacitors - MLCC; Supplier Part Number 1: C521240; Tolerance: ±5%; Voltage Rating: 1kV; Temperature Coefficient: C0G; RoHS: Yes; ComponentLink1Description: Datasheet; ComponentLink1URL: https://wmsc.lcsc.com/wmsc/upload/file/pdf/v2/lcsc/2308111810_Murata-Electronics-GRM31C5C3A102JWA3L_C521240.pdf; ComponentLink2Description: JLCPCB Part URL; ComponentLink2URL: https://jlcpcb.com/partdetail/C521240; ComponentLink3Description: LCSC Part URL; ComponentLink3URL: https://lcsc.com/product-detail/Multilayer-Ceramic-Capacitors-MLCC---SMD-SMT_Murata-Electronics-Murata-Electronics-GRM31C5C3A102JWA3L_C521240.html
footprint CAP-1206 (1206 (3216M) Capacitor)
pins: 1, 2

## GRM31C7U2J472JW32L
designator C?  Capacitance: 4.7nF  (hidden comment: *)
Capacitor, Ceramic (MLCC), 4.7nF, ±5%, 630V, U2J, ±5%, SMD 1206; Manufacturer: Murata Electronics; Manufacturer Part Number: GRM31C7U2J472JW32L; Package Size: 1206; JLCPCB Basic Part: No; JLCPCB Part Number: C162483; Supplier 1: LCSC; Category: Capacitors - MLCC; Supplier Part Number 1: C162483; Tolerance: ±5%; Voltage Rating: 630V; Temperature Coefficient: U2J; RoHS: Yes; ComponentLink1Description: Datasheet; ComponentLink1URL: https://wmsc.lcsc.com/wmsc/upload/file/pdf/v2/lcsc/2304140030_Murata-Electronics-GRM31C7U2J472JW32L_C162483.pdf; ComponentLink2Description: JLCPCB Part URL; ComponentLink2URL: https://jlcpcb.com/partdetail/C162483; ComponentLink3Description: LCSC Part URL; ComponentLink3URL: https://lcsc.com/product-detail/Multilayer-Ceramic-Capacitors-MLCC---SMD-SMT_Murata-Electronics-Murata-Electronics-GRM31C7U2J472JW32L_C162483.html
footprint CAP-1206 (1206 (3216M) Capacitor)
pins: 1, 2

## GRM31C7U3A102JW32L
designator C?  Capacitance: 1nF  (hidden comment: *)
Capacitor, Ceramic (MLCC), 1nF, ±5%, 1kV, U2J, ±5%, SMD 1206; Manufacturer: Murata Electronics; Manufacturer Part Number: GRM31C7U3A102JW32L; Package Size: 1206; JLCPCB Basic Part: No; JLCPCB Part Number: C162484; Supplier 1: LCSC; Category: Capacitors - MLCC; Supplier Part Number 1: C162484; Tolerance: ±5%; Voltage Rating: 1kV; Temperature Coefficient: U2J; RoHS: Yes; ComponentLink1Description: Datasheet; ComponentLink1URL: https://wmsc.lcsc.com/wmsc/upload/file/pdf/v2/lcsc/2304140030_Murata-Electronics-GRM31C7U3A102JW32L_C162484.pdf; ComponentLink2Description: JLCPCB Part URL; ComponentLink2URL: https://jlcpcb.com/partdetail/C162484; ComponentLink3Description: LCSC Part URL; ComponentLink3URL: https://lcsc.com/product-detail/Multilayer-Ceramic-Capacitors-MLCC---SMD-SMT_Murata-Electronics-Murata-Electronics-GRM31C7U3A102JW32L_C162484.html
footprint CAP-1206 (1206 (3216M) Capacitor)
pins: 1, 2
